# Altium footprint library PcbLib.PcbLib: 154 footprints (part 9 of 10)
Each footprint in its own frame and in the unit in brackets; x right, y up, seen from the top. Pads: shape width x height; smd on the part's side, far side on the other; paste and mask are expansions set on the pad; w line width, h text height; cw(c..) or ccw(c..) is an arc to the next point about the centre after c.
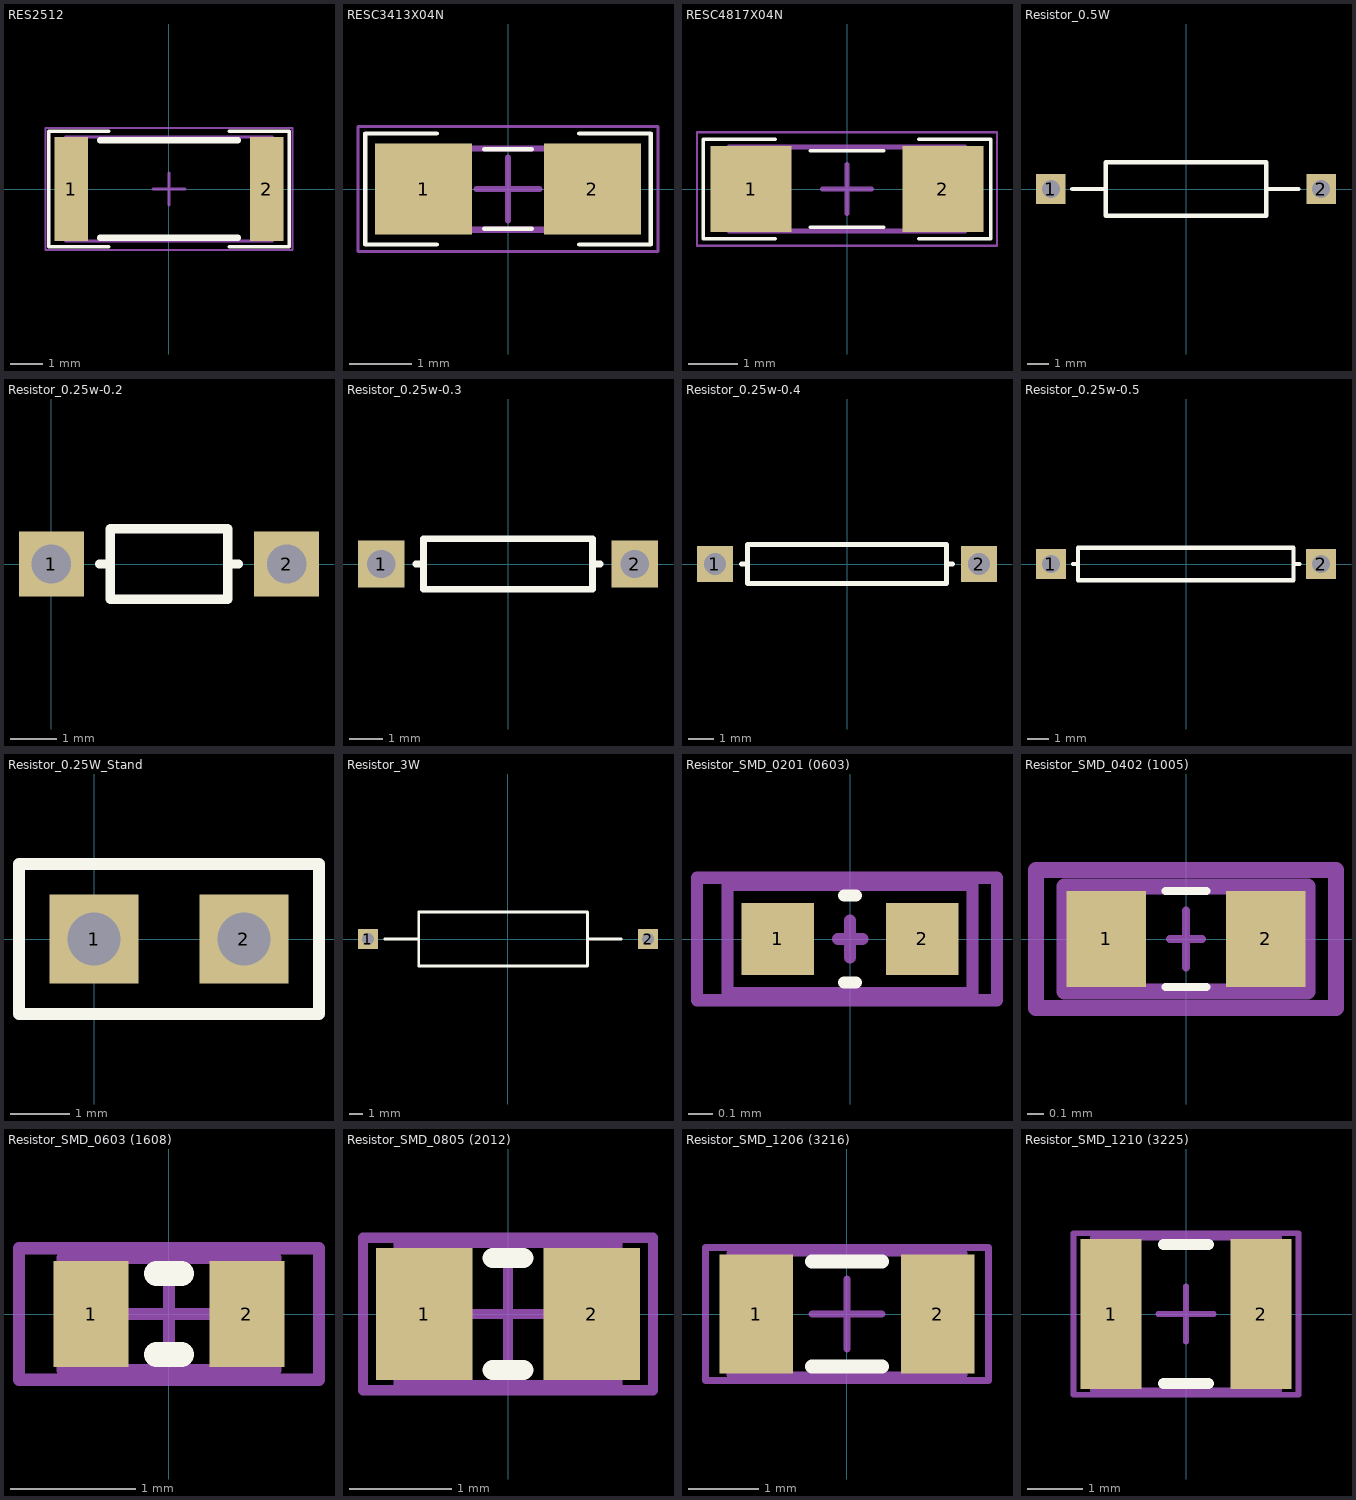
[diagram p8: the footprints below, top view; thin cyan lines are the x and y axes]

## RES2512 [mm] "Chip Resistor, 2-Leads, Body 6/40x3/20mm, IPC Medium Density DESIGNER:ABBAS BASEREH"
height 0.7
pads (2):
  rect 1.05x3.25 smd: 1(-3.05,0) 2(3.05,0)
Top Overlay:
  lines w0.1: -1.875,-1.8 -3.75,-1.8 -3.75,1.8 -1.875,1.8 ; 1.875,-1.8 3.75,-1.8 3.75,1.8 1.875,1.8
  lines w0.2: -2.15,-1.525 2.15,-1.525 ; -2.15,1.525 2.15,1.525
Mechanical 13:
  lines w0.1: -3.225,-1.625 -3.225,1.625 3.225,1.625 3.225,-1.625 -3.225,-1.625
Mechanical 15:
  lines w0.05: -3.85,-1.9 -3.85,1.9 3.85,1.9 3.85,-1.9 -3.85,-1.9
  lines w0.1: -0.5,0 0.5,0 ; 0,-0.5 0,0.5
3D body "RES2512.step": height 0.7, standoff 0, extent -3.225,-1.625 3.225,1.625

## RESC3413X04N [mm] "Chip Resistor, 2-Leads, Body 3/40x1/30mm, IPC Medium Density-Design:Abbas Basereh"
height 0.4
pads (2):
  rect 1.55x1.45 smd: 1(-1.35,0) 2(1.35,0)
Top Overlay:
  lines w0.07: -1.143,-0.889 -2.286,-0.889 -2.286,0.889 -1.143,0.889 ; -0.381,-0.635 0.381,-0.635 ; -0.381,0.635 0.381,0.635 ; 1.143,-0.889 2.286,-0.889 2.286,0.889 1.143,0.889
Mechanical 13:
  lines w0.1: -1.7,-0.65 -1.7,0.65 1.7,0.65 1.7,-0.65 -1.7,-0.65
Mechanical 15:
  lines w0.05: -2.4,-1 -2.4,1 2.4,1 2.4,-1 -2.4,-1
  lines w0.1: -0.5,0 0.5,0 ; 0,-0.5 0,0.5
3D body "User Library-0805(2012M) Res.STEP": height 0.79, standoff 0, extent -1.254,-0.622 1.254,0.622

## RESC4817X04N [mm] "Chip Resistor, 2-Leads, Body 4/80x1/70mm, IPC Medium Density-Design:Abbas Basereh"
height 0.4
pads (2):
  rect 1.65x1.75 smd: 1(-1.95,0) 2(1.95,0)
Top Overlay:
  lines w0.07: -1.46,-1.016 -2.921,-1.016 -2.921,1.016 -1.46,1.016 ; -0.75,-0.775 0.75,-0.775 ; -0.75,0.775 0.75,0.775 ; 1.46,-1.016 2.921,-1.016 2.921,1.016 1.46,1.016
Mechanical 13:
  lines w0.1: -2.4,-0.85 -2.4,0.85 2.4,0.85 2.4,-0.85 -2.4,-0.85
Mechanical 15:
  lines w0.05: -3.05,-1.15 -3.05,1.15 3.05,1.15 3.05,-1.15 -3.05,-1.15
  lines w0.1: -0.5,0 0.5,0 ; 0,-0.5 0,0.5
3D body "SW3dPS-1206 SMD Resistor.STEP": height 1, standoff 0, extent -1.6,-0.8 1.6,0.8

## Resistor_0.5W [mm]
pads (2):
  rect 1.4x1.4 hole 0.85: 1(-6.4,0) 2(6.4,0)
Top Overlay:
  lines w0.2: -5.384,0 -3.8,0 ; 3.8,0 5.324,0 ; -3.8,-1.27 -3.8,1.27 3.8,1.27 3.8,-1.27 -3.8,-1.27
3D body "Resistor_0.5W.STEP": height 4.38, standoff -2.07, extent -6.75,-1.875 6.7,1.875

## Resistor_0.25w-0.2 [mm] "Axial Device, Thru-Hole; 2 Leads; 0.3 in Pin Spacing"
height 1.524
pads (2):
  rect 1.4x1.4 hole 0.85: 1(0,0) 2(5.08,0)
Top Overlay:
  lines w0.2: 1.041,0 1.27,0 ; 3.81,0 4.039,0 ; 1.27,-0.762 3.81,-0.762 3.81,0.762 1.27,0.762 1.27,-0.762
3D body "User Library-Resistencia-2.STEP": height 2.39, standoff -1, extent -0.254,-0.848 5.334,0.848

## Resistor_0.25w-0.3 [mm] "Axial Device, Thru-Hole; 2 Leads; 0.3 in Pin Spacing"
height 1.524
pads (2):
  rect 1.4x1.4 hole 0.85: 1(-3.81,0) 2(3.81,0)
Top Overlay:
  lines w0.2: -2.769,0 -2.54,0 ; 2.769,0 2.54,0 ; 2.54,0 2.54,-0.762 -2.54,-0.762 -2.54,0.762 2.54,0.762 2.54,0
3D body "User Library-Resistencia-1.STEP": height 2.51, standoff -1, extent -4.064,-0.977 4.064,0.965

## Resistor_0.25w-0.4 [mm]
pads (2):
  rect 1.4x1.4 hole 0.85: 1(-5.152,0) 2(5.152,0)
Top Overlay:
  lines w0.2: -4.111,0 -3.882,0 ; 4.111,0 3.882,0 ; 3.882,0 3.882,0.762 -3.882,0.762 -3.882,-0.762 3.883,-0.762 3.882,0
3D body "Resistor_0.25W.STEP": height 3.43, standoff -2.04, extent -5.457,-1.156 5.312,1.156

## Resistor_0.25w-0.5 [mm] "Axial Device, Thru-Hole; 2 Leads; 0.3 in Pin Spacing"
height 1.524
pads (2):
  rect 1.4x1.4 hole 0.85: 1(-6.35,0) 2(6.35,0)
Top Overlay:
  lines w0.2: -5.309,0 -5.08,0 ; 5.029,0.762 0,0.762 -5.08,0.762 -5.08,-0.762 5.055,-0.762 5.055,0 ; 5.055,0.762 5.055,0 ; 5.334,0 5.055,0
3D body "User Library-Resistencia 0_5.STEP": height 3.6, standoff -1, extent -6.731,-1.429 6.731,1.429

## Resistor_0.25W_Stand [mm]
pads (2):
  rect 1.5x1.5 hole 0.9: 1(0,0) 2(2.54,0)
Top Overlay:
  lines w0.2: -1.27,-1.27 3.81,-1.27 3.81,1.27 -1.27,1.27 -1.27,-1.27
3D body "Resistor_0.25W_Stand.STEP": height 7.25, standoff -1.5, extent -0.922,-0.92 2.79,0.921

## Resistor_3W [mm]
pads (2):
  rect 1.5x1.5 hole 0.9: 1(-10.53,0) 2(10.53,0)
Top Overlay:
  lines w0.2: -9.26,0 -6.72,0 ; 5.98,0 8.52,0 ; -6.72,-2.032 -6.72,2.032 5.98,2.032 5.98,-2.032 -6.72,-2.032
3D body "Resistor_3W.STEP": height 7.3, standoff -3, extent -11.13,-3.3 11.07,3.3

## Resistor_SMD_0201 (0603) [mm]
pads (2):
  rect 0.3x0.3 smd: 1(-0.3,0) 2(0.3,0)
Top Overlay:
  lines w0.05: -0.025,-0.18 0.025,-0.18 ; -0.025,0.18 0.025,0.18
Mechanical 13:
  lines w0.05: -0.508,-0.225 0.508,-0.225 0.508,0.225 -0.508,0.225 -0.508,-0.225
Mechanical 15:
  lines w0.05: -0.051,0 0.051,0 ; 0,-0.076 0,0.076 ; -0.635,-0.254 0.61,-0.254 0.61,0.254 -0.635,0.254 -0.635,-0.254
3D body "User Library-RES_0603-0201.STEP": height 0.34, standoff 0, extent -0.34,-0.165 0.34,0.165

## Resistor_SMD_0402 (1005) [mm]
pads (2):
  rect 0.5x0.6 smd: 1(-0.5,0) 2(0.5,0)
Top Overlay:
  lines w0.05: -0.127,-0.3 0.127,-0.3 ; -0.127,0.3 0.127,0.3
Mechanical 13:
  lines w0.1: -0.762,-0.33 -0.762,0.33 0.762,0.33 0.762,-0.33 -0.762,-0.33
Mechanical 15:
  lines w0.05: -0.102,0 0.102,0 ; 0,-0.178 0,0.178
  lines w0.1: -0.94,-0.432 -0.94,0.432 0.94,0.432 0.94,-0.432 -0.94,-0.432
3D body "User Library-RESC1005X04N.STEP": height 0.35, standoff 0, extent -0.5,-0.25 0.5,0.25

## Resistor_SMD_0603 (1608) [mm]
pads (2):
  rect 0.6x0.85 smd: 1(-0.622,0) 2(0.622,0)
Top Overlay:
  lines w0.2: -0.1,-0.325 0.1,-0.325 ; -0.1,0.325 0.1,0.325
Mechanical 13:
  lines w0.1: -0.85,-0.45 -0.85,0.45 0.85,0.45 0.85,-0.45 -0.85,-0.45
Mechanical 15:
  lines w0.1: -0.45,0 0.45,0 ; 0,-0.45 0,0.45 ; -1.2,-0.525 -1.2,0.525 1.2,0.525 1.2,-0.525 -1.2,-0.525
3D body "0603.STEP": height 0.45, standoff 0, extent -0.762,-0.381 0.762,0.381

## Resistor_SMD_0805 (2012) [mm]
pads (2):
  rect 0.95x1.3 smd: 1(-0.825,0) 2(0.825,0)
Top Overlay:
  lines w0.2: -0.15,-0.55 0.15,-0.55 ; -0.15,0.55 0.15,0.55
Mechanical 13:
  lines w0.1: -1.075,-0.7 1.075,-0.7 1.075,0.7 -1.075,0.7 -1.075,-0.7
Mechanical 15:
  lines w0.1: -0.5,0 0.5,0 ; 0,-0.5 0,0.5 ; -1.425,-0.75 1.425,-0.75 1.425,0.75 -1.425,0.75 -1.425,-0.75
3D body "User Library-RESC2012X05N.STEP": height 0.45, standoff 0, extent -1,-0.625 1,0.625

## Resistor_SMD_1206 (3216) [mm]
pads (2):
  rect 1.05x1.7 smd: 1(-1.298,0) 2(1.298,0)
Top Overlay:
  lines w0.2: -0.5,-0.75 0.5,-0.75 ; -0.5,0.75 0.5,0.75
Mechanical 13:
  lines w0.1: -1.675,-0.875 1.675,-0.875 1.675,0.875 -1.675,0.875 -1.675,-0.875
Mechanical 15:
  lines w0.1: -0.5,0 0.5,0 ; 0,-0.5 0,0.5 ; -2.025,-0.95 2.025,-0.95 2.025,0.95 -2.025,0.95 -2.025,-0.95
3D body "User Library-RESC3216X06N.STEP": height 0.55, standoff 0, extent -1.6,-0.8 1.6,0.8

## Resistor_SMD_1210 (3225) [mm] "Chip Resistor, 2-Leads, Body 3.2x2.6mm, IPC High Density _ (0.250 W)"
height 0.7
pads (2):
  rect 1.1x2.7 smd: 1(-1.35,0) 2(1.35,0)
Top Overlay:
  lines w0.2: -0.4,-1.25 0.4,-1.25 ; -0.4,1.25 0.4,1.25
Mechanical 13:
  lines w0.1: -1.675,-1.375 1.675,-1.375 1.675,1.375 -1.675,1.375 -1.675,-1.375
Mechanical 15:
  lines w0.1: -0.5,0 0.5,0 ; 0,-0.5 0,0.5 ; -2.025,-1.45 2.025,-1.45 2.025,1.45 -2.025,1.45 -2.025,-1.45
3D body "User Library-RESC3225X06N.STEP": height 0.55, standoff 0, extent -1.6,-1.25 1.6,1.25